# Altium footprint library lib_protel_HC_BOINA.PCBLIB: 726 footprints (part 12 of 46)
Each footprint in its own frame and in the unit in brackets; x right, y up, seen from the top. Pads: shape width x height; smd on the part's side, far side on the other; paste and mask are expansions set on the pad; w line width, h text height; cw(c..) or ccw(c..) is an arc to the next point about the centre after c.
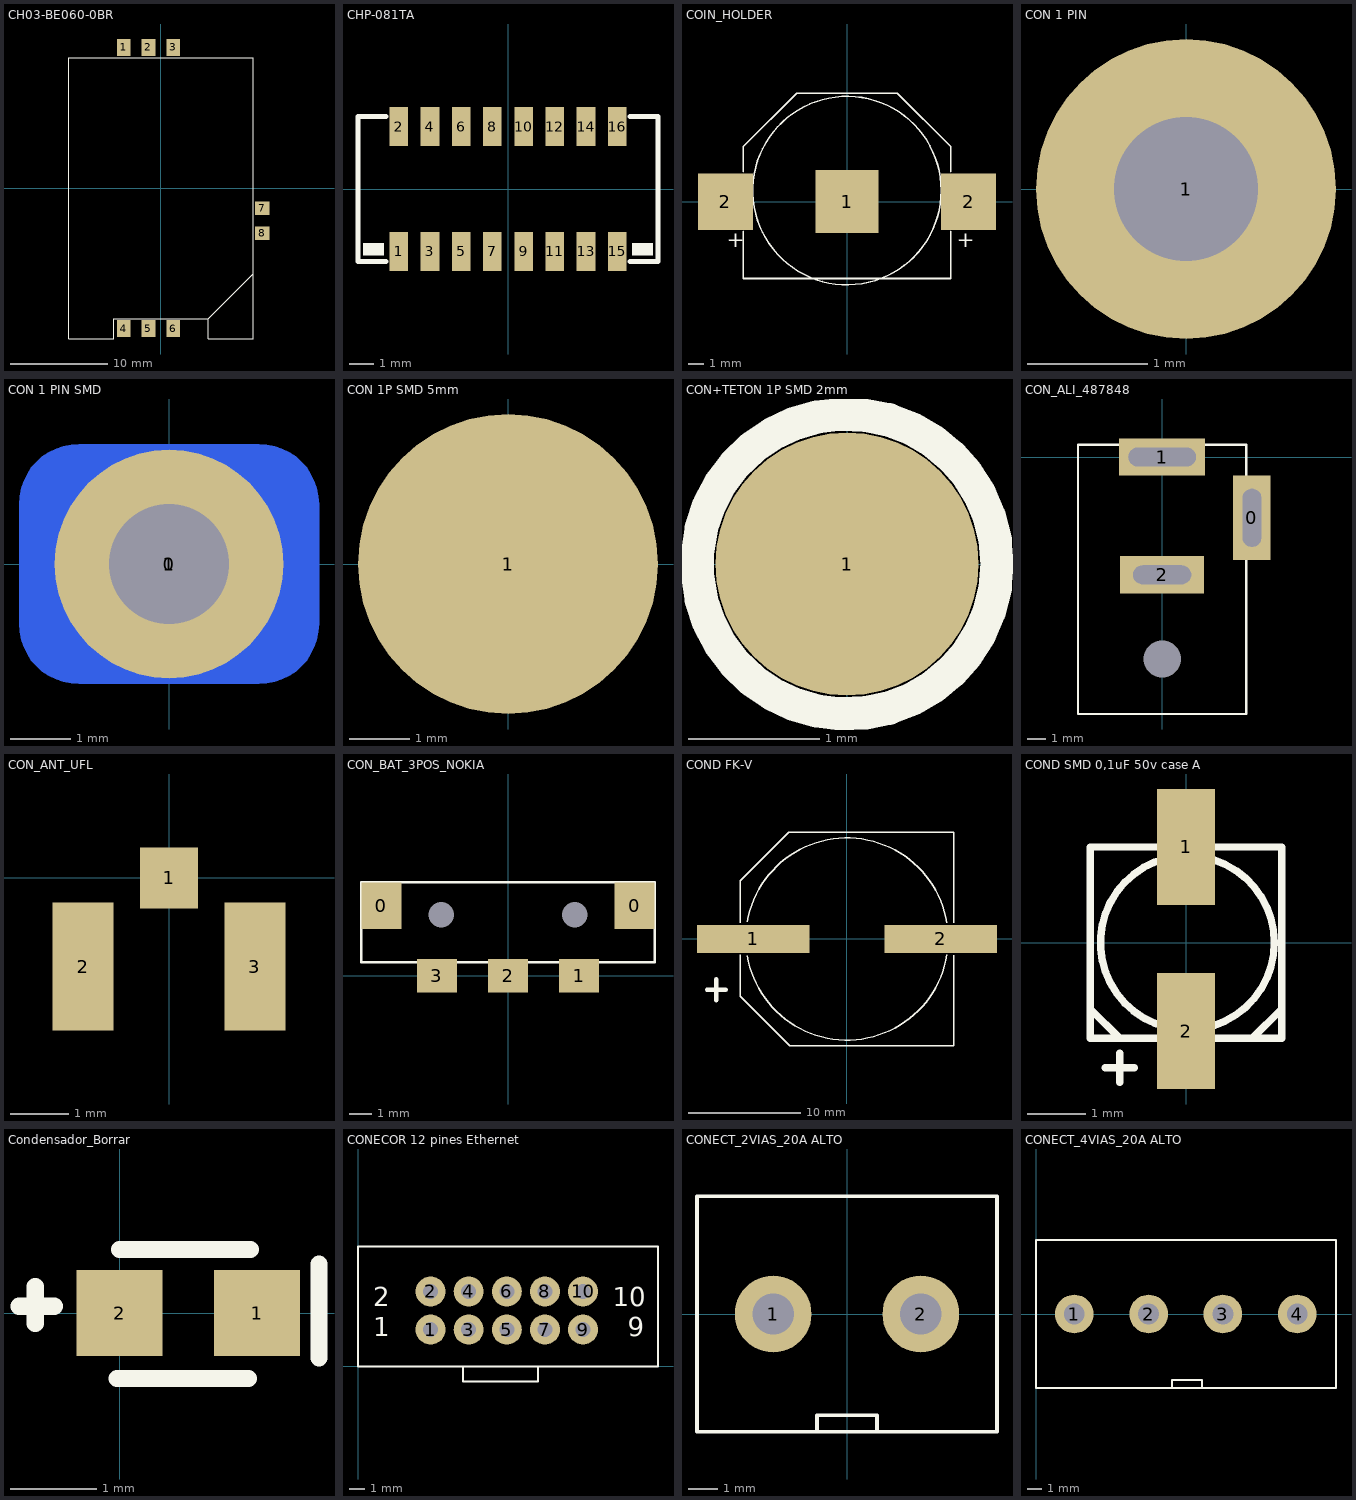
[diagram p11: the footprints below, top view; thin cyan lines are the x and y axes]

## CH03-BE060-0BR [mm]
pads (8):
  rect 1.4x1.74 smd: 1(-3.82,14.43) 2(-1.28,14.43) 3(1.28,14.43) 4(-3.82,-14.43) 5(-1.28,-14.43) 6(1.28,-14.43)
  rect 1.5x1.4 smd: 7(10.38,-2.09) 8(10.38,-4.63)
Top Layer:
  lines w0.127: 4.84,-13.41 4.84,-13.42 4.85,-13.42
Top Overlay:
  lines w0.127: 9.48,-8.79 4.85,-13.42 ; 4.85,-13.42 4.85,-15.5 9.48,-15.5 9.48,13.4 -9.48,13.4 -9.48,0 -9.48,-15.5 -4.83,-15.5 -4.83,-13.42 4.85,-13.42

## CHP-081TA [mm]
pads (16):
  rect 0.76x1.6 smd: 1(-4.445,-2.54) 2(-4.445,2.54) 3(-3.175,-2.54) 4(-3.175,2.54) 5(-1.905,-2.54) 6(-1.905,2.54) 7(-0.635,-2.54) 8(-0.635,2.54) 9(0.635,-2.54) 10(0.635,2.54) 11(1.905,-2.54) 12(1.905,2.54) 13(3.175,-2.54) 14(3.175,2.54) 15(4.445,-2.54) 16(4.445,2.54)
Top Overlay:
  rectangle: -5.9,-2.7 -5.05,-2.2
  region: 5.9,-2.2 5.05,-2.2 5.05,-2.7 5.9,-2.7
  lines w0.2: -4.95,-2.95 -6.1,-2.95 -6.1,2.95 -4.95,2.95 ; 4.95,-2.95 6.1,-2.95 6.1,2.95 4.95,2.95

## COIN_HOLDER [mm] "for S8201-46R"
pads (3):
  rect 4x4 smd: 1(0,0)
  rect 3.5x3.6 smd: 2(-7.75,0) 2(7.75,0)
Top Overlay:
  circle w0.1: c0,0.7 r6
  lines w0.1: -6.6,-1.9 -6.6,-4.9 6.6,-4.9 6.6,-1.9 ; -6.6,1.9 -6.6,3.5 -3.2,6.9 3.2,6.9 6.6,3.5 6.6,1.9
  text "+" at -7.65,-2.9 h1
  text "+" at 7,-2.9 h1

## CON 1 PIN [mm]
pads (1):
  round 2.5 hole 1.2: 1(0,0)

## CON 1 PIN SMD [mm]
pads (2):
  round 3.81 hole 2: 0(0,0)
  rrect50% 5x4 smd far side: 1(0,0)

## CON 1P SMD 5mm [mm]
pads (1):
  round 5 smd: 1(0,0)

## CON+TETON 1P SMD 2mm [mm] "Tetón Mill-max 0900-2-15-20-75-14-11-0"
height 5
pads (1):
  round 2 smd: 1(0,0)
Top Overlay:
  circle w0.254: c0,0 r1.14
3D body "mill-max-0900-2-15-20-75-14-11-0.STEP": height 5, standoff 0, extent -0.914,-0.914 0.915,0.915

## CON_ALI_487848 [mm] "CONECTOR ALIMETACIÓN 2.1 X 5.5MM"
height 11
pads (4):
  round 0 hole 2: 0(0,-10.8)
  rect 2x4.5 hole 1 slot 3.1 at 90 deg: 0(4.8,-3.25)
  rect 4.6x2 hole 1 slot 3.6 at 0 deg: 1(0,0)
  rect 4.5x2 hole 1 slot 3.1 at 0 deg: 2(0,-6.3)
Top Overlay:
  lines w0.127: -4.5,-13.74 -4.5,0.66 4.5,0.66 4.5,-13.74 -4.5,-13.74

## CON_ANT_UFL [mm] "Conector Antena U.FL"
height 5
pads (3):
  rect 1x1.05 smd: 1(0,0)
  rect 1.05x2.2 smd: 2(-1.475,-1.525) 3(1.475,-1.525)

## CON_BAT_3POS_NOKIA [mm]
pads (7):
  rect 1.8x2.1 smd: 0(-5.7,3.15) 0(5.7,3.15)
  round 0 on Top hole 1.15: 0(-3,2.75) 0(3,2.75)
  rect 1.8x1.5 smd: 1(3.2,0) 2(0,0) 3(-3.2,0)
Top Overlay:
  lines w0.127: -6.6,0.6 6.6,0.6 6.6,4.2 -6.6,4.2 -6.6,0.6

## COND FK-V [mm] "EEV-FK1E332M"
height 16.5
pads (2):
  rect 10x2.5 smd: 1(-8.35,0) 2(8.35,0)
Top Overlay:
  lines w0.12: -9.5,-1.39 -9.5,-5.08 -5.08,-9.5 9.5,-9.5 9.5,-1.43 ; -9.5,1.43 -9.5,5.17 -5.17,9.5 9.5,9.5 9.5,1.44
  lines w0.127: -8.877,-1.484 ccw(c0,0) 8.891,-1.4 ; -8.87,1.525 cw(c0,0) 8.886,1.431
  lines w0.4: -12.46,-4.52 -10.78,-4.52 ; -11.63,-5.44 -11.63,-3.59

## COND SMD 0,1uF 50v case A [mm] "condensador electrolítico aluminio smd"
height 5.4
pads (2):
  rect 1x2 smd: 1(0,1.651) 2(0,-1.524)
Top Overlay:
  circle w0.127: c0.024,0 r1.5
  lines w0.127: -1.651,-1.143 -1.143,-1.651 ; -1.397,-2.159 -0.889,-2.159 ; -1.143,-2.413 -1.143,-1.905 ; 1.143,-1.651 1.651,-1.143 ; -1.651,-1.651 1.651,-1.651 1.651,1.651 -1.651,1.651 -1.651,-1.651

## Condensador_Borrar [mm]
pads (2):
  rect 1x1 smd: 1(1.6,0) 2(0,0)
Top Overlay:
  lines w0.2: -1.17,0.08 -0.76,0.08 ; -0.98,-0.12 -0.98,0.31 ; -0.03,-0.76 1.5,-0.76 ; 0,0.74 1.52,0.74 ; 2.32,-0.52 2.32,0.57

## CONECOR 12 pines Ethernet [mm] "Conector Serial-to-Ethernet (S2E) Module"
height 6.2
pads (10):
  round 2 hole 1: 1(4.84,2.46) 2(4.84,5) 3(7.38,2.46) 4(7.38,5) 5(9.92,2.46) 6(9.92,5) 7(12.46,2.46) 8(12.46,5) 9(15,2.46) 10(15,5)
Top Overlay:
  lines w0.127: 7,0 7,-1 12,-1 12,0 ; 0,0 20,0 20,8 0,8 0,0
  text "1" at 1,2 h1.27
  text "9" at 18,2 h1.27
  text "2" at 1,4 h1.27
  text "10" at 17,4 h1.27

## CONECT_2VIAS_20A ALTO [mm] "paso 5mm altura 16.5mm"
height 16.5
pads (2):
  round 2.6 hole 1.4: 1(-2.5,0) 2(2.5,0)
Top Overlay:
  lines w0.127: -5.08,-3.988 5.08,-3.988 ; -5.08,-3.97 -5.08,3.98 ; -5.08,3.988 5.08,3.988 ; -1.016,-3.933 -1.016,-3.425 1.016,-3.425 1.016,-3.933 ; 5.08,-3.99 5.08,3.99

## CONECT_4VIAS_20A ALTO [mm] "paso 5mm altura 16.5mm 4 VÍAS."
height 16.5
pads (4):
  round 2.6 hole 1.4: 1(2.58,0) 2(7.58,0) 3(12.58,0) 4(17.58,0)
Top Overlay:
  lines w0.127: 0,-4.988 20.193,-4.988 ; 0,-4.953 0,4.953 ; 0,4.988 20.193,4.988 ; 9.144,-4.953 9.144,-4.445 11.176,-4.445 11.176,-4.953 ; 20.193,-4.953 20.193,4.953